# Altium footprint library pcb.PcbLib: 31 footprints (part 2 of 2)
Each footprint in its own frame and in the unit in brackets; x right, y up, seen from the top. Pads: shape width x height; smd on the part's side, far side on the other; paste and mask are expansions set on the pad; w line width, h text height; cw(c..) or ccw(c..) is an arc to the next point about the centre after c.
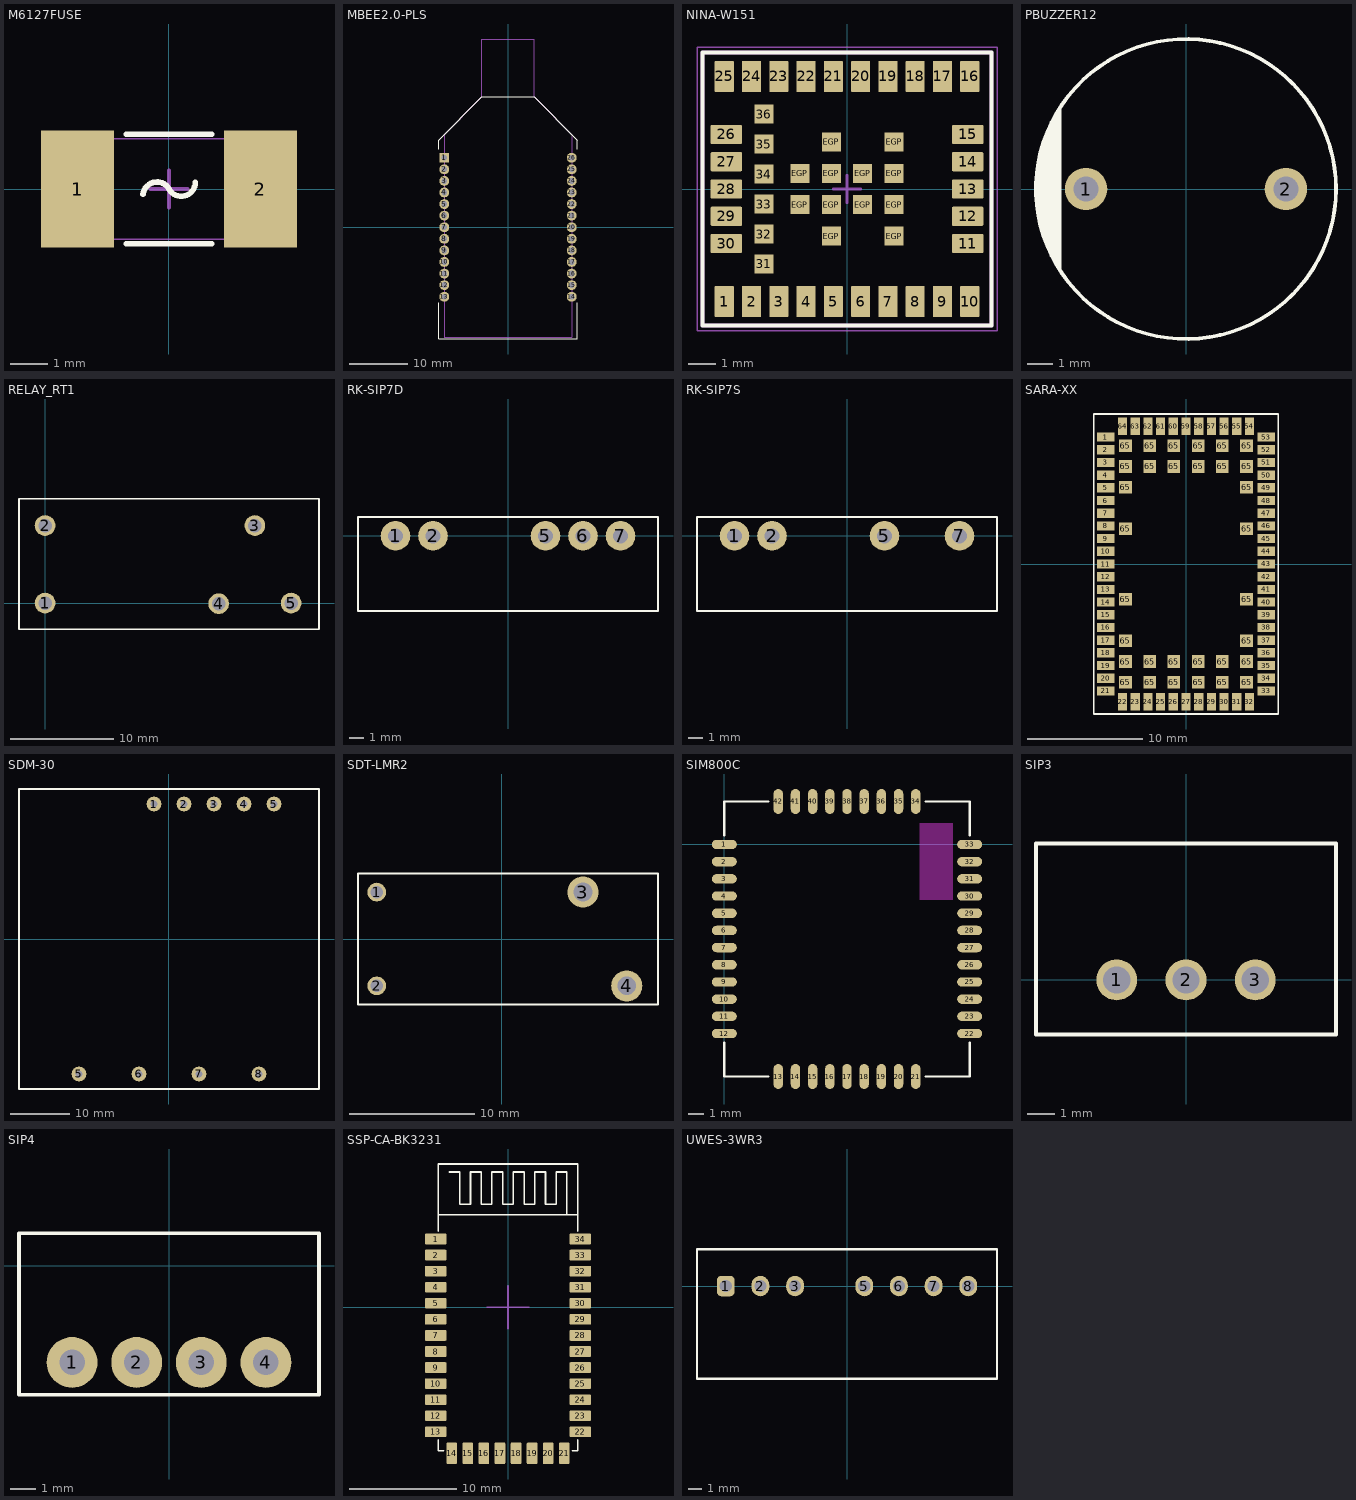
[diagram p1: the footprints below, top view; thin cyan lines are the x and y axes]

## M6127FUSE [mm] "Chip Fuse 2-Leads, Body 6,10x2,69mm, IPC High Density"
height 2.69
pads (2):
  rect 1.96x3.15 smd: 1(-2.455,0) 2(2.455,0)
Top Overlay:
  lines w0.15: -1.15,-1.475 1.15,-1.475 ; -1.15,1.475 1.15,1.475 ; -0.698,-0.142 cw(c-0.326,-0.186) 0,0 ccw(c0.33,0.178) 0.705,0.178
Top Courtyard:
  lines w0.05: -3.05,-1.35 -3.05,1.35 3.05,1.35 3.05,-1.35 -3.05,-1.35
  lines w0.1: -0.5,0 0.5,0 ; 0,-0.5 0,0.5
3D body: height 2.69, standoff 0, extent -1.6,-1.345 1.6,1.345
3D body: height 2.69, standoff 0, extent -3.05,-1.345 -1.6,1.345
3D body: height 2.69, standoff 0, extent 1.6,-1.345 3.05,1.345

## MBEE2.0-PLS [mm]
pads (26):
  rect 1.7x1.7 hole 1 unplated: 1(-11,12)
  round 1.7 hole 1 unplated: 2(-11,10) 3(-11,8) 4(-11,6) 5(-11,4) 6(-11,2) 7(-11,0) 8(-11,-2) 9(-11,-4) 10(-11,-6) 11(-11,-8) 12(-11,-10) 13(-11,-12) 14(11,-12) 15(11,-10) 16(11,-8) 17(11,-6) 18(11,-4) 19(11,-2) 20(11,0) 21(11,2) 22(11,4) 23(11,6) 24(11,8) 25(11,10) 26(11,12)
Top Overlay:
  lines w0.15: -12,-13 -12,-19.3 12,-19.3 12,-13 ; -12,13.5 -12,15 -4.5,22.5 0,22.5 4.5,22.5 12,15 12,13.5
Top Courtyard:
  lines w0.15: -11,-19 0.5,-19 11,-19 11,16 4.5,22.5 4.5,32.5 0,32.5 -4.5,32.5 -4.5,22.5 -11,16 -11,-19
3D body "User Library-MBee-868-2_0-RPSMA-PLS2-13.STEP": height 8.34, standoff -2.9, extent -12,-19.3 12,32.7

## NINA-W151 [mm] "Stand-alone Bluetooth low energy module"
height 2.2
pads (48):
  rrect10% 0.7x1.15 smd paste+0 mask+0.05: 1(-4.5,-4.125) 2(-3.5,-4.125) 3(-2.5,-4.125) 4(-1.5,-4.125) 5(-0.5,-4.125) 6(0.5,-4.125) 7(1.5,-4.125) 8(2.5,-4.125) 9(3.5,-4.125) 10(4.5,-4.125) 16(4.5,4.125) 17(3.5,4.125) 18(2.5,4.125) 19(1.5,4.125) 20(0.5,4.125) 21(-0.5,4.125) 22(-1.5,4.125) 23(-2.5,4.125) 24(-3.5,4.125) 25(-4.5,4.125)
  rrect10% 1.15x0.7 smd paste+0 mask+0.05: 11(4.425,-2) 12(4.425,-1) 13(4.425,0) 14(4.425,1) 15(4.425,2) 26(-4.425,2) 27(-4.425,1) 28(-4.425,0) 29(-4.425,-1) 30(-4.425,-2)
  rect 0.7x0.7 smd paste+0 mask+0.05: 31(-3.05,-2.75) 32(-3.05,-1.65) 33(-3.05,-0.55) 34(-3.05,0.55) 35(-3.05,1.65) 36(-3.05,2.75) EGP(-1.725,-0.575) EGP(-1.725,0.575) EGP(-0.575,-1.725) EGP(-0.575,-0.575) EGP(-0.575,0.575) EGP(-0.575,1.725) EGP(0.575,-0.575) EGP(0.575,0.575) EGP(1.725,-1.725) EGP(1.725,-0.575) EGP(1.725,0.575) EGP(1.725,1.725)
Top Overlay:
  lines w0.15: -5.3,-5 5.3,-5 5.3,5 -5.3,5 -5.3,-5
  text "." at -5.08,-5.715 h0.1
Top Courtyard:
  lines w0.15: -5.3,-5 -5.3,5 5.3,5 5.3,-5 -5.3,-5
Mechanical 13:
  lines w0.1: -5.3,-5 5.302,-5 5.302,5 -5.3,5 -5.3,-5
Mechanical 15:
  lines w0.05: -5.5,-5.2 -5.5,5.2 5.5,5.2 5.5,-5.2 -5.5,-5.2
  lines w0.1: -0.5,0 0,0 0.5,0 ; 0,-0.5 0,0.5
3D body "NINA-W131-00B.STEP": height 2.25, standoff 0.04, extent -5.3,-5 5.3,5

## PBUZZER12 [mm]
height 10
pads (2):
  round 1.7 hole 1 unplated: 1(-4,0) 2(4,0)
Top Overlay:
  circle w0.15: c0,0 r6
  region: -5,-3.254 -5.121,-3.07 -5.337,-2.687 -5.524,-2.29 -5.681,-1.879 -5.808,-1.459 -5.904,-1.03 -5.968,-0.595 -6,-0.157 -6,0.063 -6,0.283 -5.968,0.721 -5.904,1.156 -5.808,1.585 -5.681,2.005 -5.524,2.416 -5.337,2.814 -5.121,3.197 -5,3.38
  text "." at -6.985,0 h0.1
3D body: height 9, standoff 1, extent -6,-5.999 5.999,6
3D body: height 8, standoff 2, extent -5.5,-5.5 5.5,5.5
3D body: height 7, standoff 1, extent -5.5,-5.5 5.5,5.5
3D body: height 3, standoff -3, extent -4.297,-0.299 -3.7,0.3
3D body: height 3, standoff -3, extent 3.703,-0.299 4.3,0.3

## RELAY_RT1 [mm]
pads (5):
  round 2 hole 1.3: 1(0,0) 2(0,7.5) 3(20.3,7.5) 4(16.8,-0.06) 5(23.8,0)
Top Overlay:
  lines w0.15: -2.52,-2.52 26.5,-2.52 26.5,10.08 -2.52,10.08 -2.52,-2.52
3D body: height 15.7, standoff 0, extent -2.5,-2.5 26.5,10

## RK-SIP7D [mm]
height 10.2
pads (5):
  round 2 hole 1: 1(-7.62,0) 2(-5.08,0) 5(2.54,0) 6(5.08,0) 7(7.62,0)
Top Overlay:
  lines w0.15: -10.16,-5.08 -10.16,1.27 10.16,1.27 10.16,-5.08 -10.16,-5.08
  text "." at -8.255,1.905 h0.1
3D body: height 10.2, standoff 0, extent -10.159,-5.079 10.159,1.269

## RK-SIP7S [mm]
height 10.2
pads (4):
  round 2 hole 1: 1(-7.62,0) 2(-5.08,0) 5(2.54,0) 7(7.62,0)
Top Overlay:
  lines w0.15: -10.16,-5.08 -10.16,1.27 10.16,1.27 10.16,-5.08 -10.16,-5.08
  text "." at -8.89,1.905 h0.1
3D body: height 10.2, standoff 0, extent -10.159,-5.079 10.159,1.269

## SARA-XX [mm] "GSM/GPRS and GSM/EGPRS/HSPA Cellular Module"
height 3.25
pads (96):
  rect 1.5x0.8 smd paste-1: 1(-6.95,11) 2(-6.95,9.9) 3(-6.95,8.8) 4(-6.95,7.7) 5(-6.95,6.6) 6(-6.95,5.5) 7(-6.95,4.4) 8(-6.95,3.3) 9(-6.95,2.2) 10(-6.95,1.1) 11(-6.95,0) 12(-6.95,-1.1) 13(-6.95,-2.2) 14(-6.95,-3.3) 15(-6.95,-4.4) 16(-6.95,-5.5) 17(-6.95,-6.6) 18(-6.95,-7.7) 19(-6.95,-8.8) 20(-6.95,-9.9) 21(-6.95,-11) 33(6.95,-11) 34(6.95,-9.9) 35(6.95,-8.8) 36(6.95,-7.7) 37(6.95,-6.6) 38(6.95,-5.5) 39(6.95,-4.4) 40(6.95,-3.3) 41(6.95,-2.2) 42(6.95,-1.1) 43(6.95,0) 44(6.95,1.1) 45(6.95,2.2) 46(6.95,3.3) 47(6.95,4.4) 48(6.95,5.5) 49(6.95,6.6) 50(6.95,7.7) 51(6.95,8.8) 52(6.95,9.9) 53(6.95,11)
  rect 0.8x1.5 smd paste-1: 22(-5.5,-11.95) 23(-4.4,-11.95) 24(-3.3,-11.95) 25(-2.2,-11.95) 26(-1.1,-11.95) 27(0,-11.95) 28(1.1,-11.95) 29(2.2,-11.95) 30(3.3,-11.95) 31(4.4,-11.95) 32(5.5,-11.95) 54(5.5,11.95) 55(4.4,11.95) 56(3.3,11.95) 57(2.2,11.95) 58(1.1,11.95) 59(0,11.95) 60(-1.1,11.95) 61(-2.2,11.95) 62(-3.3,11.95) 63(-4.4,11.95) 64(-5.5,11.95)
  rect 1.1x1.1 smd paste-0.025: 65(-5.25,-10.25) 65(-5.25,-8.45) 65(-5.25,-6.65) 65(-5.25,-3.05) 65(-5.25,3.05) 65(-5.25,6.65) 65(-5.25,8.45) 65(-5.25,10.25) 65(-3.15,-10.25) 65(-3.15,-8.45) 65(-3.15,8.45) 65(-3.15,10.25) 65(-1.05,-10.25) 65(-1.05,-8.45) 65(-1.05,8.45) 65(-1.05,10.25) 65(1.05,-10.25) 65(1.05,-8.45) 65(1.05,8.45) 65(1.05,10.25) 65(3.15,-10.25) 65(3.15,-8.45) 65(3.15,8.45) 65(3.15,10.25) 65(5.25,-10.25) 65(5.25,-8.45) 65(5.25,-6.65) 65(5.25,-3.05) 65(5.25,3.05) 65(5.25,6.65) 65(5.25,8.45) 65(5.25,10.25)
Top Overlay:
  lines w0.15: -8,-13 -8,13 8,13 8,-13 -8,-13
  text "." at -8.255,13.335 h0.1
Top Paste:
  region: -5.125,11.225 -5.125,12.775 -5.875,12.775 -5.875,11.225
  region: -4.025,11.225 -4.025,12.775 -4.775,12.775 -4.775,11.225
  region: -2.925,11.225 -2.925,12.775 -3.675,12.775 -3.675,11.225
  region: -1.825,11.225 -1.825,12.775 -2.575,12.775 -2.575,11.225
  region: -0.725,11.225 -0.725,12.775 -1.475,12.775 -1.475,11.225
  region: 0.375,11.225 0.375,12.775 -0.375,12.775 -0.375,11.225
  region: 1.475,11.225 1.475,12.775 0.725,12.775 0.725,11.225
  region: 5.875,11.225 5.875,12.775 5.125,12.775 5.125,11.225
  region: 2.575,11.225 2.575,12.775 1.825,12.775 1.825,11.225
  region: 3.675,11.225 3.675,12.775 2.925,12.775 2.925,11.225
  region: 4.775,11.225 4.775,12.775 4.025,12.775 4.025,11.225
  rectangle: 6.225,10.625 7.775,11.375
  rectangle: 6.225,9.525 7.775,10.275
  rectangle: 6.225,8.425 7.775,9.175
  rectangle: 6.225,7.325 7.775,8.075
  rectangle: 6.225,6.225 7.775,6.975
  rectangle: 6.225,5.125 7.775,5.875
  rectangle: 6.225,4.025 7.775,4.775
  rectangle: 6.225,2.925 7.775,3.675
  rectangle: 6.225,1.825 7.775,2.575
  rectangle: 6.225,0.725 7.775,1.475
  rectangle: 6.225,-0.375 7.775,0.375
  rectangle: 6.225,-1.475 7.775,-0.725
  rectangle: 6.225,-2.575 7.775,-1.825
  rectangle: 6.225,-3.675 7.775,-2.925
  rectangle: 6.225,-4.775 7.775,-4.025
  rectangle: 6.225,-5.875 7.775,-5.125
  rectangle: 6.225,-6.975 7.775,-6.225
  rectangle: 6.225,-8.075 7.775,-7.325
  rectangle: 6.225,-9.175 7.775,-8.425
  rectangle: 6.225,-10.275 7.775,-9.525
  rectangle: 6.225,-11.375 7.775,-10.625
  region: 5.875,-12.775 5.875,-11.225 5.125,-11.225 5.125,-12.775
  region: 4.775,-12.775 4.775,-11.225 4.025,-11.225 4.025,-12.775
  region: 3.675,-12.775 3.675,-11.225 2.925,-11.225 2.925,-12.775
  region: 2.575,-12.775 2.575,-11.225 1.825,-11.225 1.825,-12.775
  region: 1.475,-12.775 1.475,-11.225 0.725,-11.225 0.725,-12.775
  region: 0.375,-12.775 0.375,-11.225 -0.375,-11.225 -0.375,-12.775
  region: -0.725,-12.775 -0.725,-11.225 -1.475,-11.225 -1.475,-12.775
  region: -1.825,-12.775 -1.825,-11.225 -2.575,-11.225 -2.575,-12.775
  region: -2.925,-12.775 -2.925,-11.225 -3.675,-11.225 -3.675,-12.775
  region: -4.025,-12.775 -4.025,-11.225 -4.775,-11.225 -4.775,-12.775
  region: -5.125,-12.775 -5.125,-11.225 -5.875,-11.225 -5.875,-12.775
  rectangle: -7.775,-11.375 -6.225,-10.625
  rectangle: -7.775,-10.275 -6.225,-9.525
  rectangle: -7.775,-9.175 -6.225,-8.425
  rectangle: -7.775,-8.075 -6.225,-7.325
  rectangle: -7.775,-6.975 -6.225,-6.225
  rectangle: -7.775,-5.875 -6.225,-5.125
  rectangle: -7.775,-4.775 -6.225,-4.025
  rectangle: -7.775,-3.675 -6.225,-2.925
  rectangle: -7.775,-2.575 -6.225,-1.825
  rectangle: -7.775,-1.475 -6.225,-0.725
  rectangle: -7.775,-0.375 -6.225,0.375
  rectangle: -7.775,0.725 -6.225,1.475
  rectangle: -7.775,1.825 -6.225,2.575
  rectangle: -7.775,2.925 -6.225,3.675
  rectangle: -7.775,4.025 -6.225,4.775
  rectangle: -7.775,5.125 -6.225,5.875
  rectangle: -7.775,6.225 -6.225,6.975
  rectangle: -7.775,7.325 -6.225,8.075
  rectangle: -7.775,8.425 -6.225,9.175
  rectangle: -7.775,9.525 -6.225,10.275
  rectangle: -7.775,10.625 -6.225,11.375
3D body "SARA.STEP": height 3, standoff 0, extent -8,-13 8,13
3D body "SARA.STEP": height 0.13, standoff -2.87, extent -8,-13.05 8,12.95

## SDM-30 [mm]
pads (9):
  round 2.5 hole 1.2: 1(-2.54,22.86) 2(2.54,22.86) 3(7.62,22.86) 4(12.7,22.86) 5(-15.24,-22.86) 5(17.78,22.86) 6(-5.08,-22.86) 7(5.08,-22.86) 8(15.24,-22.86)
Top Overlay:
  lines w0.3: -25.4,-25.4 -25.4,25.4 25.4,25.4 25.4,-25.4 -25.4,-25.4
3D body: height 0, standoff -4.5, extent -15.74,-23.36 -14.74,-22.36
3D body: height 0, standoff -4.5, extent -5.58,-23.36 -4.58,-22.36
3D body: height 0, standoff -4.5, extent 4.58,-23.36 5.58,-22.36
3D body: height 0, standoff -4.5, extent 14.74,-23.36 15.74,-22.36
3D body: height 0, standoff -4.5, extent 17.28,22.36 18.28,23.36
3D body: height 0, standoff -4.5, extent 12.2,22.36 13.2,23.36
3D body: height 0, standoff -4.5, extent 7.12,22.36 8.12,23.36
3D body: height 0, standoff -4.5, extent 2.04,22.36 3.04,23.36
3D body: height 0, standoff -4.5, extent -3.04,22.36 -2.04,23.36
3D body: height 16, standoff 0, extent -25.4,-25.4 25.4,25.4

## SDT-LMR2 [mm]
height 25
pads (4):
  round 1.5 hole 1: 1(-10,3.75) 2(-10,-3.75)
  round 2.5 hole 1.5: 3(6.5,3.75) 4(10,-3.75)
Top Overlay:
  lines w0.15: -11.5,-5.25 12.5,-5.25 12.5,5.25 -11.5,5.25 -11.5,-5.25
  text "." at -10.16,5.715 h0.1
3D body: height 25, standoff 0.5, extent -11.499,-5.249 12.499,5.249

## SIM800C [mm]
pads (42):
  oval 1.6x0.6 smd: 1(0,0) 2(0,-1.1) 3(0,-2.2) 4(0,-3.3) 5(0,-4.4) 6(0,-5.5) 7(0,-6.6) 8(0,-7.7) 9(0,-8.8) 10(0,-9.9) 11(0,-11) 12(0,-12.1) 22(15.7,-12.1) 23(15.7,-11) 24(15.7,-9.9) 25(15.7,-8.8) 26(15.7,-7.7) 27(15.7,-6.6) 28(15.7,-5.5) 29(15.7,-4.4) 30(15.7,-3.3) 31(15.7,-2.2) 32(15.7,-1.1) 33(15.7,0)
  oval 0.6x1.6 smd: 13(3.45,-14.85) 14(4.55,-14.85) 15(5.65,-14.85) 16(6.75,-14.85) 17(7.85,-14.85) 18(8.95,-14.85) 19(10.05,-14.85) 20(11.15,-14.85) 21(12.25,-14.85) 34(12.25,2.75) 35(11.15,2.75) 36(10.05,2.75) 37(8.95,2.75) 38(7.85,2.75) 39(6.75,2.75) 40(5.65,2.75) 41(4.55,2.75) 42(3.45,2.75)
Top Layer keep-out:
  rectangle: 12.481,-3.566 14.631,1.384
Top Overlay:
  lines w0.15: 0,-12.7 0,-14.85 2.8,-14.85 ; 0,0.6 0,2.75 2.8,2.75 ; 12.9,-14.85 15.7,-14.85 15.7,-12.7 ; 12.9,2.75 15.7,2.75 15.7,0.6
  text "." at -1.5,1.384 h0.1
3D body: height 2.3, standoff 0.2, extent 1,-14.05 14.631,1.95
3D body: height 1.1, standoff 0, extent 3.15,2.25 3.75,2.75
3D body: height 1.1, standoff 0, extent 4.25,2.25 4.85,2.75
3D body: height 1.1, standoff 0, extent 5.35,2.25 5.95,2.75
3D body: height 1.1, standoff 0, extent 6.45,2.25 7.05,2.75
3D body: height 1.1, standoff 0, extent 7.55,2.25 8.15,2.75
3D body: height 1.1, standoff 0, extent 8.65,2.25 9.25,2.75
3D body: height 1.1, standoff 0, extent 9.75,2.25 10.35,2.75
3D body: height 1.1, standoff 0, extent 10.85,2.25 11.45,2.75
3D body: height 1.1, standoff 0, extent 11.95,2.25 12.55,2.75
3D body: height 1.1, standoff 0, extent 11.95,-14.85 12.55,-14.35
3D body: height 1.1, standoff 0, extent 10.85,-14.85 11.45,-14.35
3D body: height 1.1, standoff 0, extent 9.75,-14.85 10.35,-14.35
3D body: height 1.1, standoff 0, extent 8.65,-14.85 9.25,-14.35
3D body: height 1.1, standoff 0, extent 7.55,-14.85 8.15,-14.35
3D body: height 1.1, standoff 0, extent 6.45,-14.85 7.05,-14.35
3D body: height 1.1, standoff 0, extent 5.35,-14.85 5.95,-14.35
3D body: height 1.1, standoff 0, extent 4.25,-14.85 4.85,-14.35
3D body: height 1.1, standoff 0, extent 3.15,-14.85 3.75,-14.35
3D body: height 1.1, standoff 0, extent 15.2,-12.4 15.7,-11.8
3D body: height 1.1, standoff 0, extent 15.2,-11.3 15.7,-10.7
3D body: height 1.1, standoff 0, extent 15.2,-10.2 15.7,-9.6
3D body: height 1.1, standoff 0, extent 15.2,-9.1 15.7,-8.5
3D body: height 1.1, standoff 0, extent 15.2,-8 15.7,-7.4
3D body: height 1.1, standoff 0, extent 15.2,-6.9 15.7,-6.3
3D body: height 1.1, standoff 0, extent 15.2,-5.8 15.7,-5.2
3D body: height 1.1, standoff 0, extent 15.2,-4.7 15.7,-4.1
3D body: height 1.1, standoff 0, extent 15.2,-3.6 15.7,-3
3D body: height 1.1, standoff 0, extent 15.2,-2.5 15.7,-1.9
3D body: height 1.1, standoff 0, extent 15.2,-1.4 15.7,-0.8
3D body: height 1.1, standoff 0, extent 15.2,-0.3 15.7,0.3
3D body: height 1, standoff 0.1, extent 0,-14.85 15.7,2.75
3D body: height 1.1, standoff 0, extent 0,-12.4 0.5,-11.8
3D body: height 1.1, standoff 0, extent 0,-11.3 0.5,-10.7
3D body: height 1.1, standoff 0, extent 0,-10.2 0.5,-9.6
3D body: height 1.1, standoff 0, extent 0,-9.1 0.5,-8.5
3D body: height 1.1, standoff 0, extent 0,-8 0.5,-7.4
3D body: height 1.1, standoff 0, extent 0,-6.9 0.5,-6.3
3D body: height 1.1, standoff 0, extent 0,-5.8 0.5,-5.2
3D body: height 1.1, standoff 0, extent 0,-4.7 0.5,-4.1
3D body: height 1.1, standoff 0, extent 0,-3.6 0.5,-3
3D body: height 1.1, standoff 0, extent 0,-2.5 0.5,-1.9
3D body: height 1.1, standoff 0, extent 0,-1.4 0.5,-0.8
3D body: height 1.1, standoff 0, extent 0,-0.3 0.5,0.3

## SIP3 [mm]
pads (3):
  round 1.5 hole 1: 1(-2.54,0) 2(0,0) 3(2.54,0)
Top Overlay:
  lines w0.15: -5.5,-2 0.54,-2 5.5,-2 5.5,5 -5.5,5 -5.5,-2
  text "." at -3.5,-2.5 h0.1
3D body: height 10.16, standoff 0, extent -5.5,-2 5.5,5

## SIP4 [mm]
height 10.2
pads (4):
  round 2 hole 1: 1(-3.81,-3.81) 2(-1.27,-3.81) 3(1.27,-3.81) 4(3.81,-3.81)
Top Overlay:
  lines w0.15: -5.9,-5.08 5.9,-5.08 5.9,1.27 -5.9,1.27 -5.9,-5.08
  text "." at -4.95,-5.715 h0.1
3D body: height 10.2, standoff 0, extent -5.8,-4.9 5.8,1.1

## SSP-CA-BK3231 [mm]
height 2
pads (34):
  rrect20% 2x1 smd: 1(-6.75,6.375) 2(-6.75,4.875) 3(-6.75,3.375) 4(-6.75,1.875) 5(-6.75,0.375) 6(-6.75,-1.125) 7(-6.75,-2.625) 8(-6.75,-4.125) 9(-6.75,-5.625) 10(-6.75,-7.125) 11(-6.75,-8.625) 12(-6.75,-10.125) 13(-6.75,-11.625) 22(6.75,-11.625) 23(6.75,-10.125) 24(6.75,-8.625) 25(6.75,-7.125) 26(6.75,-5.625) 27(6.75,-4.125) 28(6.75,-2.625) 29(6.75,-1.125) 30(6.75,0.375) 31(6.75,1.875) 32(6.75,3.375) 33(6.75,4.875) 34(6.75,6.375)
  rrect20% 1x2 smd: 14(-5.25,-13.625) 15(-3.75,-13.625) 16(-2.25,-13.625) 17(-0.75,-13.625) 18(0.75,-13.625) 19(2.25,-13.625) 20(3.75,-13.625) 21(5.25,-13.625)
Top Overlay:
  lines w0.15: -6.5,-12.375 -6.5,-13.375 -6,-13.375 ; -6.5,7.125 -6.5,13.375 6.5,13.375 6.5,7.125 ; -6.5,8.625 6.5,8.625 ; -5.5,12.625 -4.5,12.625 -4.5,9.625 -3.5,9.625 -3.5,12.625 -2.5,12.625 -2.5,9.625 -1.5,9.625 -1.5,12.625 -0.5,12.625 -0.5,9.625 0.5,9.625 0.5,12.625 1.5,12.625 1.5,9.625 2.5,9.625 2.5,12.625 3.5,12.625 3.5,9.625 4.5,9.625 4.5,12.625 5.5,12.625 5.5,8.625 ; 6,-13.375 6.5,-13.375 6.5,-12.375
  text "." at -7.62,7.62 h0.1
Mechanical 15:
  lines w0.15: -2,0 0,0 2,0 ; 0,-2 0,2

## UWES-3WR3 [mm]
height 12
pads (7):
  rrect50% 1.3x1.5 hole 0.9: 1(-8.89,0)
  oval 1.3x1.5 hole 0.9: 2(-6.35,0) 3(-3.81,0) 5(1.27,0) 6(3.81,0) 7(6.35,0) 8(8.89,0)
Top Overlay:
  lines w0.15: -11,-6.8 0,-6.8 11,-6.8 11,2.7 0,2.7 -11,2.7 -11,-6.8
  text "." at -9.05,3.285 h0.1
3D body: height 12, standoff 0.5, extent -10.999,-6.799 10.999,2.699